# Altium footprint library CI.PcbLib: 42 footprints (part 2 of 3)
Each footprint in its own frame and in the unit in brackets; x right, y up, seen from the top. Pads: shape width x height; smd on the part's side, far side on the other; paste and mask are expansions set on the pad; w line width, h text height; cw(c..) or ccw(c..) is an arc to the next point about the centre after c.
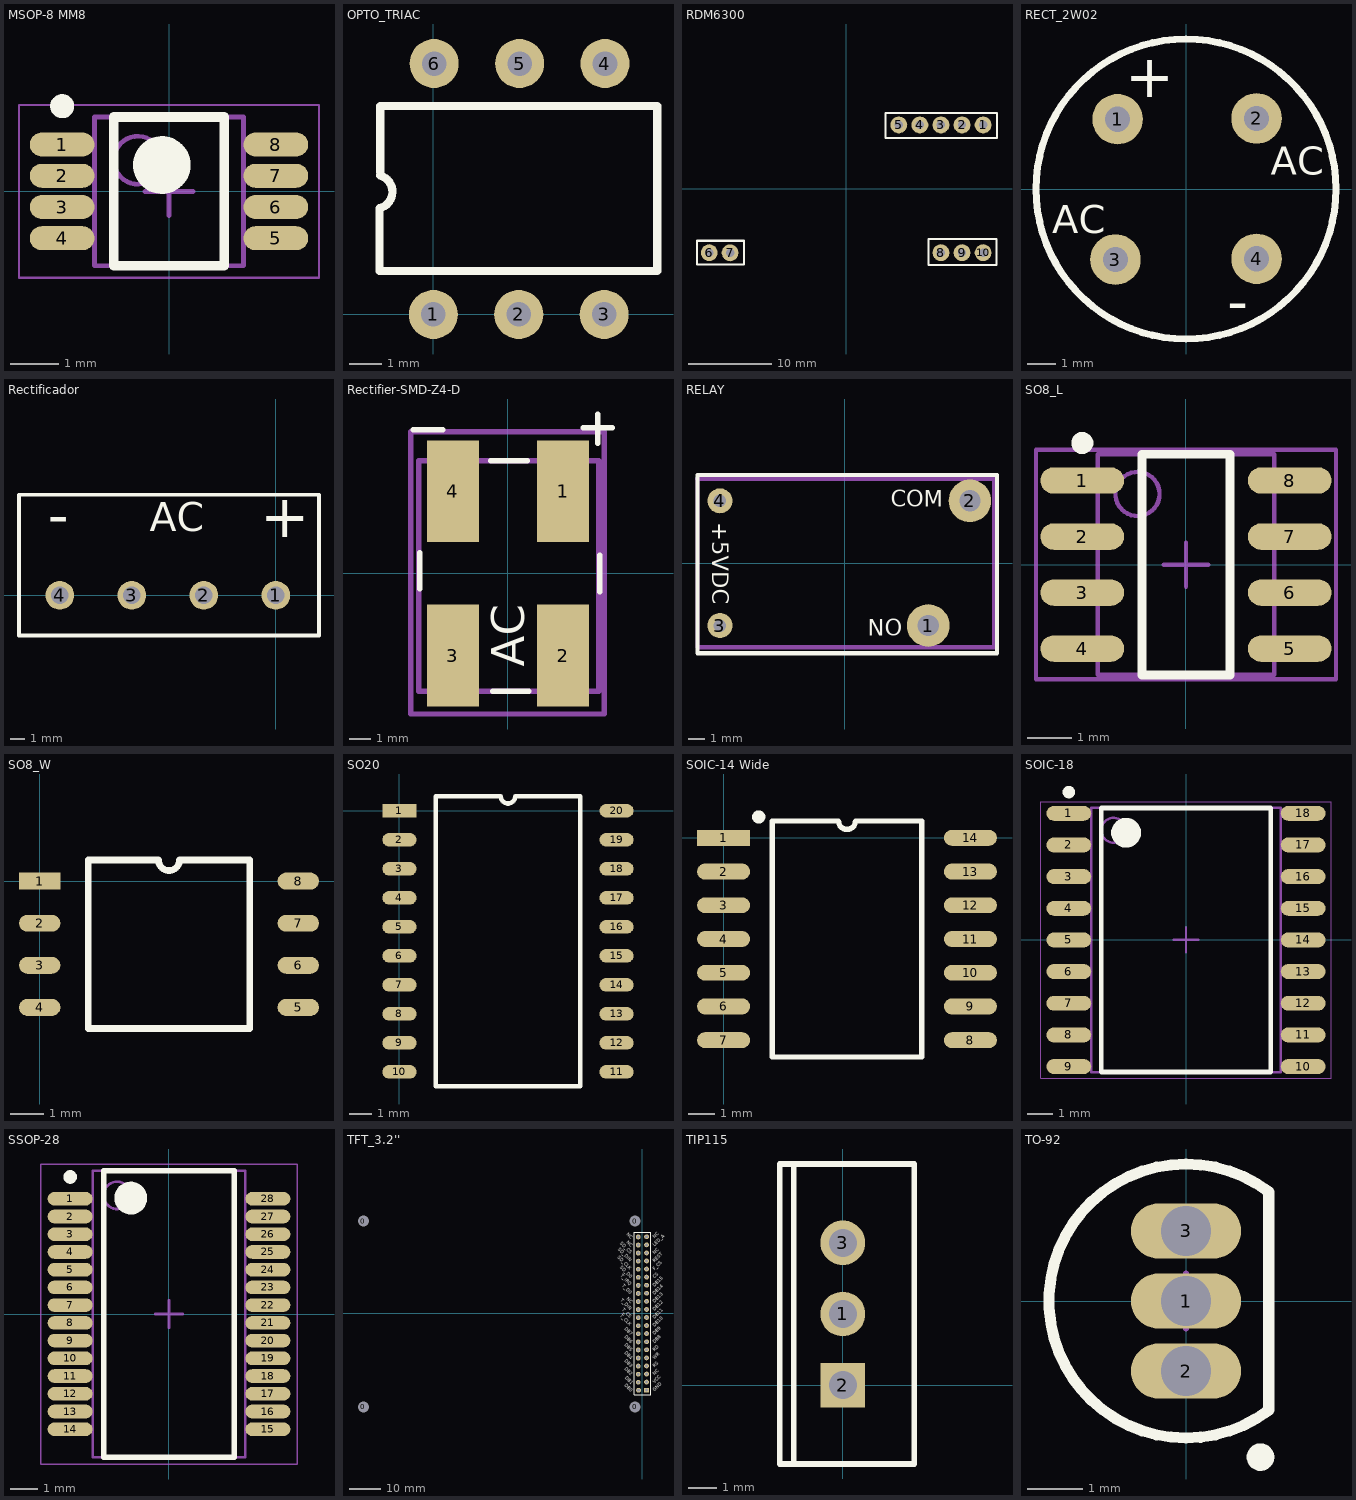
[diagram p1: the footprints below, top view; thin cyan lines are the x and y axes]

## MSOP-8 MM8 [mm]
height 1.02
pads (8):
  oval 1.35x0.5 smd: 1(-2.225,0.975) 2(-2.225,0.325) 3(-2.225,-0.325) 4(-2.225,-0.975) 5(2.225,-0.975) 6(2.225,-0.325) 7(2.225,0.325) 8(2.225,0.975)
Top Overlay:
  circle w0.6: c-0.15,0.55 r0.3
  circle w0.25: c-2.225,1.775 r0.125
  lines w0.2: -1.15,-1.55 1.15,-1.55 1.15,1.55 -1.15,1.55 -1.15,-1.55
Mechanical 13:
  circle w0.1: c-0.65,0.65 r0.5
  lines w0.1: -1.55,-1.55 1.55,-1.55 1.55,1.55 -1.55,1.55 -1.55,-1.55
Mechanical 15:
  lines w0.05: -3.125,-1.8 3.125,-1.8 3.125,1.8 -3.125,1.8 -3.125,-1.8
  lines w0.1: -0.5,0 0.5,0 ; 0,-0.5 0,0.5
3D body: height 0.92, standoff 0, extent -2.527,-1.524 2.527,1.524

## OPTO_TRIAC [mil] "MOC302x MOC306x OptoTRIAC with Zero Crossing"
pads (6):
  round 60 hole 30: 1(0,0) 2(104.5,0) 3(209,0) 4(210,307) 5(105.5,307) 6(1,307)
Top Overlay:
  lines w10: -65,170 cw(c-70.66,150.13) -66,130 -66,53 274,53 274,255 -65,255 -65,174
3D body: height 208.66, standoff -78.74, extent -35,-1 245.31,308.84

## RDM6300 [mil] "125kHz RFID Reader"
pads (10):
  round 80 hole 40: 1(650,303.65) 2(550,303.65) 3(450,303.65) 4(350,303.65) 5(250,303.65) 6(-650,-302.65) 7(-551,-303.65) 8(450,-302.65) 9(550,-302.65) 10(650,-302.65)
Top Overlay:
  lines w10: -708,-358 -708,-246 -485,-246 -485,-358 -708,-358 ; 187,242 716,242 716,360 187,360 187,242 ; 391,-361 713,-361 713,-237 391,-237 391,-361
3D body: height 225.98, standoff -226.2, extent -747,-351.64 749.07,354.65

## RECT_2W02 [mm] "Puente Rectificador 2W02"
pads (4):
  round 1.8 hole 0.9: 1(-2.438,2.489) 2(2.515,2.515) 3(-2.515,-2.515) 4(2.515,-2.489)
Top Overlay:
  circle w0.254: c0,0 r5.348
  text "AC" at 3.023,0.508 h1
  text "AC" at -4.775,-1.575 h1
  text "-" at 1.473,-4.724 h1.52
  text "+" at -2.159,3.277 h1.52
3D body: height 7.4, standoff -10.6, extent -4.475,-4.475 4.525,4.525

## Rectificador [mm] "Puente Rectificador KBL10"
pads (4):
  round 2 hole 1.2: 1(0,0) 2(-5,0) 3(-10,0) 4(-15,0)
Top Overlay:
  lines w0.254: -17.831,-2.794 -17.831,6.985 2.997,6.985 2.997,-2.794 -17.831,-2.794
  text "-" at -15.85,4.14 h3
  text "+" at -1.067,4.013 h3
  text "AC" at -8.763,4.445 h2
3D body: height 16.2, standoff -26.2, extent -17,-1.85 2,4

## Rectifier-SMD-Z4-D [mm] "Bridge Rectifier Surface Mount Z4-D"
pads (4):
  rect 2.4x4.7 smd: 1(2.55,3.8) 2(2.55,-3.8) 3(-2.55,-3.8) 4(-2.55,3.8)
Top Overlay:
  lines w0.254: -4.369,6.629 -3.023,6.629 ; -4.089,-0.718 -4.089,0.959 ; -0.787,5.2 0.889,5.2 ; -0.711,-5.442 0.965,-5.442 ; 3.48,6.731 4.826,6.731 ; 4.153,6.02 4.153,7.366 ; 4.242,-0.845 4.242,0.832
  text "AC" at 0.762,-4.318 h1.52
Mechanical 13:
  lines w0.254: -4.115,-5.442 -4.115,5.2 4.191,5.2 4.191,-5.442 -4.115,-5.442
Mechanical 15:
  lines w0.254: -4.496,-6.502 -4.496,6.553 4.445,6.553 4.445,-6.502 -4.496,-6.502
3D body: height 1.5, standoff -0.05, extent -4.013,-5.434 4.187,5.166

## RELAY [mm] "General Purpose Relay SPST-NO"
pads (4):
  round 2.6 hole 1.3: 1(5.08,-3.8) 2(7.62,3.8)
  round 1.524 hole 0.762: 3(-7.62,-3.8) 4(-7.62,3.8)
Top Overlay:
  lines w0.254: -8.992,-5.486 9.271,-5.486 9.271,5.385 -8.992,5.385 -8.992,-5.486
  text "NO" at 1.397,-4.42 h1
  text "COM" at 2.794,3.454 h1
  text "+5VDC" at -8.077,2.489 h1
Mechanical 15:
  lines w0.254: -9.017,5.131 9.093,5.131 9.093,-5.131 -8.992,-5.131 -8.992,5.105
3D body: height 14.6, standoff -4.1, extent -8.954,-5.11 9.246,5.09

## SO8_L [mm] "SOIC-8 Narrow, Pitch 1.27mm, OP07"
height 1.75
pads (8):
  oval 1.9x0.6 smd: 1(-2.35,1.905) 2(-2.35,0.635) 3(-2.35,-0.635) 4(-2.35,-1.905) 5(2.35,-1.905) 6(2.35,-0.635) 7(2.35,0.635) 8(2.35,1.905)
Top Overlay:
  circle w0.25: c-2.35,2.755 r0.125
  lines w0.2: -1,-2.5 1,-2.5 1,2.5 -1,2.5 -1,-2.5
Mechanical 13:
  circle w0.1: c-1.1,1.6 r0.5
  lines w0.1: -2,-2.5 2,-2.5 2,2.5 -2,2.5 -2,-2.5
Mechanical 15:
  lines w0.1: -0.5,0 0.5,0 ; 0,-0.5 0,0.5 ; -3.4,-2.6 3.4,-2.6 3.4,2.6 -3.4,2.6 -3.4,-2.6
3D body: height 1.7, standoff 0, extent -3,-2.424 3,2.476

## SO8_W [mm] "SOIC-8 Wide"
pads (8):
  rect 1.25x0.51 smd: 1(0,0)
  oval 1.25x0.51 smd: 2(0,-1.27) 3(0,-2.54) 4(0,-3.81) 5(7.8,-3.81) 6(7.8,-2.54) 7(7.8,-1.27) 8(7.8,0)
Top Overlay:
  lines w0.2: 1.46,-4.445 6.34,-4.445 6.34,0.635 4.217,0.635 cw(c3.9,0.635) 3.582,0.635 1.46,0.635 1.46,-4.445
3D body: height 1.75, standoff -0.01, extent -0.14,-4.635 7.962,0.825

## SO20 [mm] "SOT163-1: plastic small outline package; 20 leads; body width 7.5 mm"
pads (20):
  rect 1.5x0.6 smd: 1(0,0)
  oval 1.5x0.6 smd: 2(0,-1.27) 3(0,-2.54) 4(0,-3.81) 5(0,-5.08) 6(0,-6.35) 7(0,-7.62) 8(0,-8.89) 9(0,-10.16) 10(0,-11.43) 11(9.5,-11.43) 12(9.5,-10.16) 13(9.5,-8.89) 14(9.5,-7.62) 15(9.5,-6.35) 16(9.5,-5.08) 17(9.5,-3.81) 18(9.5,-2.54) 19(9.5,-1.27) 20(9.5,0)
Top Overlay:
  lines w0.2: 1.585,-12.065 7.915,-12.065 7.915,0.635 5.067,0.635 cw(c4.75,0.635) 4.432,0.635 1.585,0.635 1.585,-12.065
3D body: height 2.7, standoff 0, extent -0.476,-12.115 9.824,0.685

## SOIC-14 Wide [mm]
pads (14):
  rect 2x0.6 smd: 1(0,0)
  oval 2x0.6 smd: 2(0,-1.27) 3(0,-2.54) 4(0,-3.81) 5(0,-5.08) 6(0,-6.35) 7(0,-7.62) 8(9.3,-7.62) 9(9.3,-6.35) 10(9.3,-5.08) 11(9.3,-3.81) 12(9.3,-2.54) 13(9.3,-1.27) 14(9.3,0)
Top Overlay:
  circle w0.25: c1.323,0.787 r0.125
  lines w0.2: 1.835,-8.255 7.465,-8.255 7.465,0.635 4.967,0.635 cw(c4.65,0.635) 4.332,0.635 1.835,0.635 1.835,-8.255
3D body: height 2, standoff 0, extent -0.433,-8.215 9.73,0.595

## SOIC-18 [mm] "SOIC, 18-Leads, Body 10,35x7,50mm, Pitch 1,27mm, IPC Medium Density"
height 2.65
pads (18):
  oval 1.8x0.6 smd: 1(-4.7,5.08) 2(-4.7,3.81) 3(-4.7,2.54) 4(-4.7,1.27) 5(-4.7,0) 6(-4.7,-1.27) 7(-4.7,-2.54) 8(-4.7,-3.81) 9(-4.7,-5.08) 10(4.7,-5.08) 11(4.7,-3.81) 12(4.7,-2.54) 13(4.7,-1.27) 14(4.7,0) 15(4.7,1.27) 16(4.7,2.54) 17(4.7,3.81) 18(4.7,5.08)
Top Overlay:
  circle w0.25: c-4.7,5.93 r0.125
  circle w0.6: c-2.4,4.3 r0.3
  lines w0.2: -3.4,-5.3 -3.4,5.3 3.4,5.3 3.4,-5.3 -3.4,-5.3
Mechanical 13:
  circle w0.1: c-2.9,4.4 r0.5
  lines w0.1: -3.8,-5.3 -3.8,5.3 3.8,5.3 3.8,-5.3 -3.8,-5.3
Mechanical 15:
  lines w0.05: -5.825,-5.55 -5.825,5.55 5.825,5.55 5.825,-5.55 -5.825,-5.55
  lines w0.1: -0.5,0 0.5,0 ; 0,-0.5 0,0.5
3D body: height 2.65, standoff 0, extent -5.15,-5.765 5.15,5.765

## SSOP-28 [mm] "SOP, 28-Leads, Body 10.20x5.30mm, Pitch 0.65mm, IPC Medium Density"
height 2
pads (28):
  oval 1.65x0.5 smd: 1(-3.625,4.225) 2(-3.625,3.575) 3(-3.625,2.925) 4(-3.625,2.275) 5(-3.625,1.625) 6(-3.625,0.975) 7(-3.625,0.325) 8(-3.625,-0.325) 9(-3.625,-0.975) 10(-3.625,-1.625) 11(-3.625,-2.275) 12(-3.625,-2.925) 13(-3.625,-3.575) 14(-3.625,-4.225) 15(3.625,-4.225) 16(3.625,-3.575) 17(3.625,-2.925) 18(3.625,-2.275) 19(3.625,-1.625) 20(3.625,-0.975) 21(3.625,-0.325) 22(3.625,0.325) 23(3.625,0.975) 24(3.625,1.625) 25(3.625,2.275) 26(3.625,2.925) 27(3.625,3.575) 28(3.625,4.225)
Top Overlay:
  circle w0.6: c-1.4,4.25 r0.3
  circle w0.25: c-3.625,5.025 r0.125
  lines w0.2: -2.4,-5.25 2.4,-5.25 2.4,5.25 -2.4,5.25 -2.4,-5.25
Mechanical 13:
  circle w0.1: c-1.9,4.35 r0.5
  lines w0.1: -2.8,-5.25 2.8,-5.25 2.8,5.25 -2.8,5.25 -2.8,-5.25
Mechanical 15:
  lines w0.05: -4.7,-5.5 4.7,-5.5 4.7,5.5 -4.7,5.5 -4.7,-5.5
  lines w0.1: -0.5,0 0.5,0 ; 0,-0.5 0,0.5
3D body: height 2.16, standoff 0, extent -3.878,-5.165 3.878,5.165

## TFT_3.2'' [mil] "TFT LCD 3.2''"
pads (44):
  round 118.11 hole 133.86: 0(-3457.01,-1157.83) 0(-3457.01,1145.32) 0(-90.87,-1157.83) 0(-90.87,1145.32)
  round 60 hole 35.43: 0(-51.5,148.47) 0(-51.5,848.47) 0(-51.5,948.47) 0(51.5,-750) 0(51.5,750.53) 0(51.5,950.53) 2(-48.5,-950.53) 3(51.5,-849.47) 4(-51.5,-851.53) 6(-51.5,-752.05) 7(51.5,-650) 8(-51.5,-652.05) 9(51.5,-550) 10(-51.5,-552.05) 11(51.5,-450) 12(-51.5,-452.06) 13(51.5,-350) 14(-51.5,-352.06) 15(51.5,-248.94) 16(-51.5,-251) 17(51.5,-149.47) 18(-51.5,-151.53) 19(51.5,-49.47) 20(-51.5,-51.53) 21(51.5,50.53) 22(-51.5,48.47) 23(51.5,150.53) 25(51.5,250.53) 26(-51.5,248.47) 27(51.5,350.53) 28(-51.5,348.47) 29(51.5,450.53) 30(-51.5,448.47) 31(51.5,550.53) 32(-51.5,548.47) 33(51.5,650.53) 34(-51.5,648.47) 36(-51.5,748.47) 37(51.5,850.53)
  rect 59.06x59.06 hole 35.43: 1(51.5,-949.53)
Top Overlay:
  lines w10: -101.5,-1006.53 103.5,-1006.53 103.5,1008.47 -101.5,1008.47 -101.5,-1006.53
  text "NC" at 153.5,928.47 h39.37
  text "LED_A" at 153.5,828.42 h39.37
  text "NC" at 153.5,728.37 h39.37
  text "REST" at 153.5,628.31 h39.37
  text "F_CS" at 153.5,528.26 h39.37
  text "CS" at 153.5,428.21 h39.37
  text "DB15" at 153.5,328.16 h39.37
  text "DB14" at 153.5,228.1 h39.37
  text "DB13" at 153.5,128.05 h39.37
  text "DB12" at 153.5,28 h39.37
  text "DB11" at 153.5,-72.05 h39.37
  text "DB10" at 153.5,-172.11 h39.37
  text "DB9" at 153.5,-272.16 h39.37
  text "DB8" at 153.5,-372.21 h39.37
  text "RD" at 153.5,-472.26 h39.37
  text "WR" at 153.5,-572.32 h39.37
  text "RS" at 153.5,-672.37 h39.37
  text "NC" at 153.5,-772.42 h39.37
  text "VCC" at 153.5,-872.47 h39.37
  text "GND" at 153.5,-972.53 h39.37
  text "NC" at -198.18,976.47 h39.37
  text "NC" at -198.18,876.58 h39.37
  text "SD_CS" at -281.67,864.83 h39.37
  text "SD_DIN" at -304.86,788.13 h39.37
  text "SD_CLK" at -309.5,692.88 h39.37
  text "SD_D0" at -281.67,565.17 h39.37
  text "T_IRQ" at -277.03,460.64 h39.37
  text "T_D0" at -253.84,337.57 h39.37
  text "NC" at -198.18,177.38 h39.37
  text "T_DIN" at -277.03,160.99 h39.37
  text "T_CS" at -253.84,37.91 h39.37
  text "T_CLK" at -281.67,-34.14 h39.37
  text "DB7" at -226.01,-194.33 h39.37
  text "DB6" at -226.01,-294.21 h39.37
  text "DB5" at -226.01,-394.1 h39.37
  text "DB4" at -226.01,-493.99 h39.37
  text "DB3" at -226.01,-593.87 h39.37
  text "DB2" at -226.01,-693.76 h39.37
  text "DB1" at -216.73,-802.92 h39.37
  text "DB0" at -226.01,-893.53 h39.37
3D body: height 682.99, standoff -102.36, extent -3578.29,-1251.21 122.5,1268.47

## TIP115 [mm] "PNP Epitaxial Silicon Darlington Transistor"
pads (3):
  round 1.6 hole 1: 1(0,2.54) 3(0,5.08)
  rect 1.6x1.6 hole 1: 2(0,0)
Top Overlay:
  lines w0.2: -1.75,-2.81 -1.75,7.89 ; -2.25,-2.81 -2.25,7.89 2.55,7.89 2.55,-2.81 -2.25,-2.81
3D body: height 19.1, standoff -9.37, extent -2.729,-2.602 1.632,7.558

## TO-92 [mm] "TO, Flat Index; 3 In-Line, Axial Leads; Body Dia. 4.5mm; Leads 0.51 x 0.48 mm (max)"
height 6.86
pads (3):
  oval 2x1 hole 0.9: 1(0,0) 2(0,-1.27) 3(0,1.27)
Top Overlay:
  circle w0.25: c1.35,-2.83 r0.125
  lines w0.2: 1.5,-1.98 cw(c0,0) 1.5,1.98 1.5,-1.98
Mechanical 13:
  lines w0.1: 1.5,-1.98 cw(c0,0) 1.5,1.98 1.5,-1.98
Mechanical 15:
  lines w0.1: -0.5,0 0.5,0 ; 0,-0.5 0,0.5
3D body: height 10.31, standoff -5.8, extent -3.1,-3.1 1.71,3.1